# Altium footprint library lib_datalogger.PcbLib: 866 footprints (part 52 of 55)
Each footprint in its own frame and in the unit in brackets; x right, y up, seen from the top. Pads: shape width x height; smd on the part's side, far side on the other; paste and mask are expansions set on the pad; w line width, h text height; cw(c..) or ccw(c..) is an arc to the next point about the centre after c.
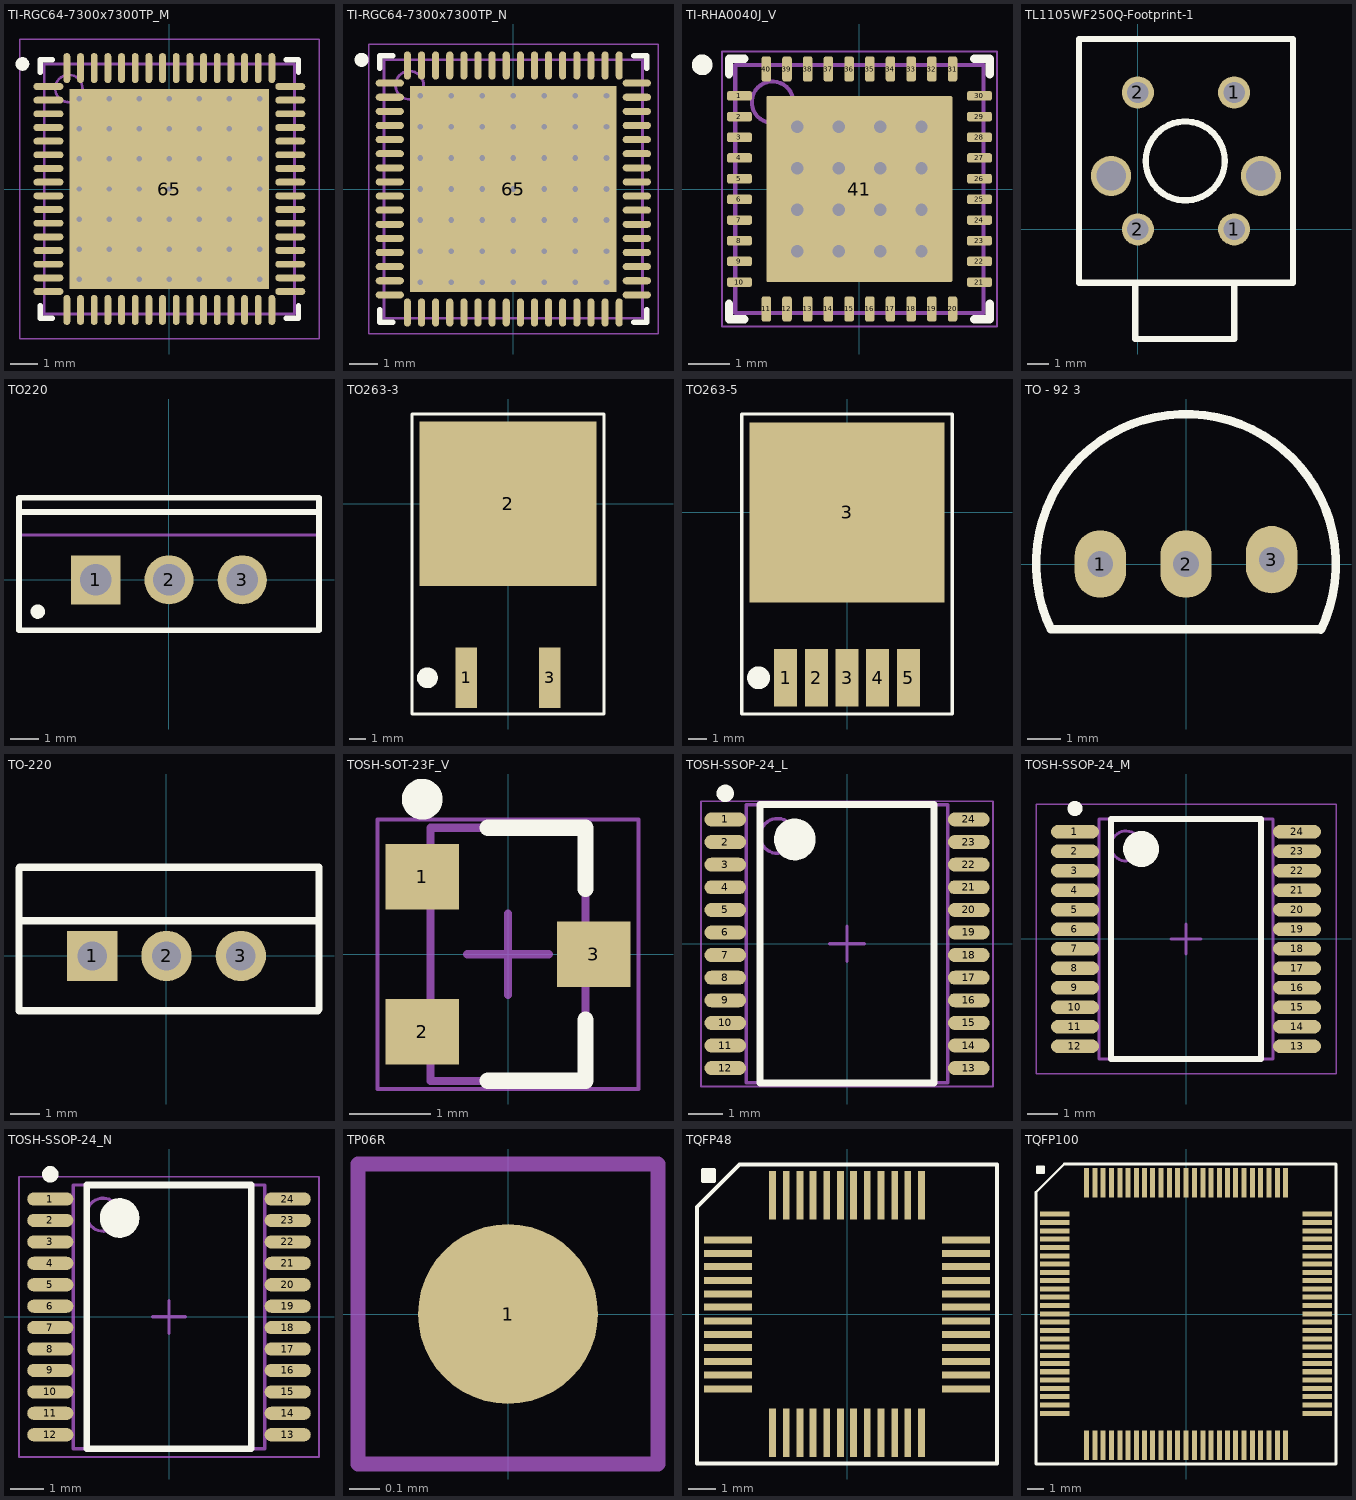
[diagram p51: the footprints below, top view; thin cyan lines are the x and y axes]

## TI-RGC64-7300x7300TP_M [mm] "QFN, 64-Leads, Body 9.15x9.15mm, Pitch 0.50mm, Thermal Pad 7.30x7.30mm, IPC Low Density"
height 1
pads (65):
  oval 1.1x0.25 smd: 1(-4.425,3.75) 2(-4.425,3.25) 3(-4.425,2.75) 4(-4.425,2.25) 5(-4.425,1.75) 6(-4.425,1.25) 7(-4.425,0.75) 8(-4.425,0.25) 9(-4.425,-0.25) 10(-4.425,-0.75) 11(-4.425,-1.25) 12(-4.425,-1.75) 13(-4.425,-2.25) 14(-4.425,-2.75) 15(-4.425,-3.25) 16(-4.425,-3.75) 33(4.425,-3.75) 34(4.425,-3.25) 35(4.425,-2.75) 36(4.425,-2.25) 37(4.425,-1.75) 38(4.425,-1.25) 39(4.425,-0.75) 40(4.425,-0.25) 41(4.425,0.25) 42(4.425,0.75) 43(4.425,1.25) 44(4.425,1.75) 45(4.425,2.25) 46(4.425,2.75) 47(4.425,3.25) 48(4.425,3.75)
  oval 0.25x1.1 smd: 17(-3.75,-4.425) 18(-3.25,-4.425) 19(-2.75,-4.425) 20(-2.25,-4.425) 21(-1.75,-4.425) 22(-1.25,-4.425) 23(-0.75,-4.425) 24(-0.25,-4.425) 25(0.25,-4.425) 26(0.75,-4.425) 27(1.25,-4.425) 28(1.75,-4.425) 29(2.25,-4.425) 30(2.75,-4.425) 31(3.25,-4.425) 32(3.75,-4.425) 49(3.75,4.425) 50(3.25,4.425) 51(2.75,4.425) 52(2.25,4.425) 53(1.75,4.425) 54(1.25,4.425) 55(0.75,4.425) 56(0.25,4.425) 57(-0.25,4.425) 58(-0.75,4.425) 59(-1.25,4.425) 60(-1.75,4.425) 61(-2.25,4.425) 62(-2.75,4.425) 63(-3.25,4.425) 64(-3.75,4.425)
  rect 7.3x7.3 smd: 65(0,0)
via -3.3,3.3 diameter 0.5 hole 0.2
via -2.2,3.3 diameter 0.5 hole 0.2
via -1.1,3.3 diameter 0.5 hole 0.2
via 0,3.3 diameter 0.5 hole 0.2
via 1.1,3.3 diameter 0.5 hole 0.2
via 2.2,3.3 diameter 0.5 hole 0.2
via 3.3,3.3 diameter 0.5 hole 0.2
via -3.3,2.2 diameter 0.5 hole 0.2
via -2.2,2.2 diameter 0.5 hole 0.2
via -1.1,2.2 diameter 0.5 hole 0.2
via 0,2.2 diameter 0.5 hole 0.2
via 1.1,2.2 diameter 0.5 hole 0.2
via 2.2,2.2 diameter 0.5 hole 0.2
via 3.3,2.2 diameter 0.5 hole 0.2
via -3.3,1.1 diameter 0.5 hole 0.2
via -2.2,1.1 diameter 0.5 hole 0.2
via -1.1,1.1 diameter 0.5 hole 0.2
via 0,1.1 diameter 0.5 hole 0.2
via 1.1,1.1 diameter 0.5 hole 0.2
via 2.2,1.1 diameter 0.5 hole 0.2
via 3.3,1.1 diameter 0.5 hole 0.2
via -3.3,0 diameter 0.5 hole 0.2
via -2.2,0 diameter 0.5 hole 0.2
via -1.1,0 diameter 0.5 hole 0.2
via 0,0 diameter 0.5 hole 0.2
via 1.1,0 diameter 0.5 hole 0.2
via 2.2,0 diameter 0.5 hole 0.2
via 3.3,0 diameter 0.5 hole 0.2
via -3.3,-1.1 diameter 0.5 hole 0.2
via -2.2,-1.1 diameter 0.5 hole 0.2
via -1.1,-1.1 diameter 0.5 hole 0.2
via 0,-1.1 diameter 0.5 hole 0.2
via 1.1,-1.1 diameter 0.5 hole 0.2
via 2.2,-1.1 diameter 0.5 hole 0.2
via 3.3,-1.1 diameter 0.5 hole 0.2
via -3.3,-2.2 diameter 0.5 hole 0.2
via -2.2,-2.2 diameter 0.5 hole 0.2
via -1.1,-2.2 diameter 0.5 hole 0.2
via 0,-2.2 diameter 0.5 hole 0.2
via 1.1,-2.2 diameter 0.5 hole 0.2
via 2.2,-2.2 diameter 0.5 hole 0.2
via 3.3,-2.2 diameter 0.5 hole 0.2
via -3.3,-3.3 diameter 0.5 hole 0.2
via -2.2,-3.3 diameter 0.5 hole 0.2
via -1.1,-3.3 diameter 0.5 hole 0.2
via 0,-3.3 diameter 0.5 hole 0.2
via 1.1,-3.3 diameter 0.5 hole 0.2
via 2.2,-3.3 diameter 0.5 hole 0.2
via 3.3,-3.3 diameter 0.5 hole 0.2
Top Overlay:
  circle w0.25: c-5.375,4.575 r0.125
  lines w0.2: -4.725,-4.275 -4.725,-4.725 -4.275,-4.725 ; -4.725,4.275 -4.725,4.725 -4.275,4.725 ; 4.275,-4.725 4.725,-4.725 4.725,-4.275 ; 4.275,4.725 4.725,4.725 4.725,4.275
Mechanical 13:
  circle w0.1: c-3.675,3.675 r0.5
  lines w0.1: -4.575,-4.575 -4.575,4.575 4.575,4.575 4.575,-4.575 -4.575,-4.575
Mechanical 15:
  lines w0.05: -5.475,-5.475 -5.475,5.475 5.475,5.475 5.475,-5.475 -5.475,-5.475
  lines w0.1: -0.5,0 0.5,0 ; 0,-0.5 0,0.5
3D body "PQFN50P900X900X100_HS-65N.step": height 1, standoff 0, extent -4.578,-4.575 4.572,4.575

## TI-RGC64-7300x7300TP_N [mm] "QFN, 64-Leads, Body 9.15x9.15mm, Pitch 0.50mm, Thermal Pad 7.30x7.30mm, IPC Medium Density"
height 1
pads (65):
  oval 1x0.25 smd: 1(-4.375,3.75) 2(-4.375,3.25) 3(-4.375,2.75) 4(-4.375,2.25) 5(-4.375,1.75) 6(-4.375,1.25) 7(-4.375,0.75) 8(-4.375,0.25) 9(-4.375,-0.25) 10(-4.375,-0.75) 11(-4.375,-1.25) 12(-4.375,-1.75) 13(-4.375,-2.25) 14(-4.375,-2.75) 15(-4.375,-3.25) 16(-4.375,-3.75) 33(4.375,-3.75) 34(4.375,-3.25) 35(4.375,-2.75) 36(4.375,-2.25) 37(4.375,-1.75) 38(4.375,-1.25) 39(4.375,-0.75) 40(4.375,-0.25) 41(4.375,0.25) 42(4.375,0.75) 43(4.375,1.25) 44(4.375,1.75) 45(4.375,2.25) 46(4.375,2.75) 47(4.375,3.25) 48(4.375,3.75)
  oval 0.25x1 smd: 17(-3.75,-4.375) 18(-3.25,-4.375) 19(-2.75,-4.375) 20(-2.25,-4.375) 21(-1.75,-4.375) 22(-1.25,-4.375) 23(-0.75,-4.375) 24(-0.25,-4.375) 25(0.25,-4.375) 26(0.75,-4.375) 27(1.25,-4.375) 28(1.75,-4.375) 29(2.25,-4.375) 30(2.75,-4.375) 31(3.25,-4.375) 32(3.75,-4.375) 49(3.75,4.375) 50(3.25,4.375) 51(2.75,4.375) 52(2.25,4.375) 53(1.75,4.375) 54(1.25,4.375) 55(0.75,4.375) 56(0.25,4.375) 57(-0.25,4.375) 58(-0.75,4.375) 59(-1.25,4.375) 60(-1.75,4.375) 61(-2.25,4.375) 62(-2.75,4.375) 63(-3.25,4.375) 64(-3.75,4.375)
  rect 7.3x7.3 smd: 65(0,0)
via -3.3,3.3 diameter 0.5 hole 0.2
via -2.2,3.3 diameter 0.5 hole 0.2
via -1.1,3.3 diameter 0.5 hole 0.2
via 0,3.3 diameter 0.5 hole 0.2
via 1.1,3.3 diameter 0.5 hole 0.2
via 2.2,3.3 diameter 0.5 hole 0.2
via 3.3,3.3 diameter 0.5 hole 0.2
via -3.3,2.2 diameter 0.5 hole 0.2
via -2.2,2.2 diameter 0.5 hole 0.2
via -1.1,2.2 diameter 0.5 hole 0.2
via 0,2.2 diameter 0.5 hole 0.2
via 1.1,2.2 diameter 0.5 hole 0.2
via 2.2,2.2 diameter 0.5 hole 0.2
via 3.3,2.2 diameter 0.5 hole 0.2
via -3.3,1.1 diameter 0.5 hole 0.2
via -2.2,1.1 diameter 0.5 hole 0.2
via -1.1,1.1 diameter 0.5 hole 0.2
via 0,1.1 diameter 0.5 hole 0.2
via 1.1,1.1 diameter 0.5 hole 0.2
via 2.2,1.1 diameter 0.5 hole 0.2
via 3.3,1.1 diameter 0.5 hole 0.2
via -3.3,0 diameter 0.5 hole 0.2
via -2.2,0 diameter 0.5 hole 0.2
via -1.1,0 diameter 0.5 hole 0.2
via 0,0 diameter 0.5 hole 0.2
via 1.1,0 diameter 0.5 hole 0.2
via 2.2,0 diameter 0.5 hole 0.2
via 3.3,0 diameter 0.5 hole 0.2
via -3.3,-1.1 diameter 0.5 hole 0.2
via -2.2,-1.1 diameter 0.5 hole 0.2
via -1.1,-1.1 diameter 0.5 hole 0.2
via 0,-1.1 diameter 0.5 hole 0.2
via 1.1,-1.1 diameter 0.5 hole 0.2
via 2.2,-1.1 diameter 0.5 hole 0.2
via 3.3,-1.1 diameter 0.5 hole 0.2
via -3.3,-2.2 diameter 0.5 hole 0.2
via -2.2,-2.2 diameter 0.5 hole 0.2
via -1.1,-2.2 diameter 0.5 hole 0.2
via 0,-2.2 diameter 0.5 hole 0.2
via 1.1,-2.2 diameter 0.5 hole 0.2
via 2.2,-2.2 diameter 0.5 hole 0.2
via 3.3,-2.2 diameter 0.5 hole 0.2
via -3.3,-3.3 diameter 0.5 hole 0.2
via -2.2,-3.3 diameter 0.5 hole 0.2
via -1.1,-3.3 diameter 0.5 hole 0.2
via 0,-3.3 diameter 0.5 hole 0.2
via 1.1,-3.3 diameter 0.5 hole 0.2
via 2.2,-3.3 diameter 0.5 hole 0.2
via 3.3,-3.3 diameter 0.5 hole 0.2
Top Overlay:
  circle w0.25: c-5.375,4.575 r0.125
  lines w0.2: -4.725,-4.275 -4.725,-4.725 -4.275,-4.725 ; -4.725,4.275 -4.725,4.725 -4.275,4.725 ; 4.275,-4.725 4.725,-4.725 4.725,-4.275 ; 4.275,4.725 4.725,4.725 4.725,4.275
Mechanical 13:
  circle w0.1: c-3.675,3.675 r0.5
  lines w0.1: -4.575,-4.575 -4.575,4.575 4.575,4.575 4.575,-4.575 -4.575,-4.575
Mechanical 15:
  lines w0.05: -5.125,-5.125 -5.125,5.125 5.125,5.125 5.125,-5.125 -5.125,-5.125
  lines w0.1: -0.5,0 0.5,0 ; 0,-0.5 0,0.5
3D body "PQFN50P900X900X100_HS-65N.step": height 1, standoff 0, extent -4.578,-4.575 4.572,4.575

## TI-RHA0040J_V [mm] "QFN, 40-Leads, Body 6x6mm, Pitch 0.5mm, Thermal Pad 4.5 x 4.5mm, TI Recommended"
height 1
pads (41):
  rrect43% 0.6x0.23 smd mask+0.07: 1(-2.9,2.25) 2(-2.9,1.75) 3(-2.9,1.25) 4(-2.9,0.75) 5(-2.9,0.25) 6(-2.9,-0.25) 7(-2.9,-0.75) 8(-2.9,-1.25) 9(-2.9,-1.75) 10(-2.9,-2.25) 21(2.9,-2.25) 22(2.9,-1.75) 23(2.9,-1.25) 24(2.9,-0.75) 25(2.9,-0.25) 26(2.9,0.25) 27(2.9,0.75) 28(2.9,1.25) 29(2.9,1.75) 30(2.9,2.25)
  rrect43% 0.23x0.6 smd mask+0.07: 11(-2.25,-2.9) 12(-1.75,-2.9) 13(-1.25,-2.9) 14(-0.75,-2.9) 15(-0.25,-2.9) 16(0.25,-2.9) 17(0.75,-2.9) 18(1.25,-2.9) 19(1.75,-2.9) 20(2.25,-2.9) 31(2.25,2.9) 32(1.75,2.9) 33(1.25,2.9) 34(0.75,2.9) 35(0.25,2.9) 36(-0.25,2.9) 37(-0.75,2.9) 38(-1.25,2.9) 39(-1.75,2.9) 40(-2.25,2.9)
  rrect2% 4.5x4.5 smd paste-2.5: 41(0,0)
via -1.5,1.5 diameter 0.6 hole 0.3
via -1.5,-1.5 diameter 0.6 hole 0.3
via 1.5,-1.5 diameter 0.6 hole 0.3
via 1.5,1.5 diameter 0.6 hole 0.3
via 0.5,1.5 diameter 0.6 hole 0.3
via 0.5,0.5 diameter 0.6 hole 0.3
via 0.5,-0.5 diameter 0.6 hole 0.3
via 0.5,-1.5 diameter 0.6 hole 0.3
via 1.5,-0.5 diameter 0.6 hole 0.3
via 1.5,0.5 diameter 0.6 hole 0.3
via -1.5,0.5 diameter 0.6 hole 0.3
via -1.5,-0.5 diameter 0.6 hole 0.3
via -0.5,-1.5 diameter 0.6 hole 0.3
via -0.5,-0.5 diameter 0.6 hole 0.3
via -0.5,0.5 diameter 0.6 hole 0.3
via -0.5,1.5 diameter 0.6 hole 0.3
Top Overlay:
  circle w0.25: c-3.8,3 r0.125
  lines w0.2: -3.15,-2.775 -3.15,-3.15 -2.775,-3.15 ; -3.15,2.775 -3.15,3.15 -2.775,3.15 ; 2.775,-3.15 3.15,-3.15 3.15,-2.775 ; 2.775,3.15 3.15,3.15 3.15,2.775
Top Paste:
  rectangle: -0.6,-2.1 0.6,-0.9
  rectangle: -0.6,0.9 0.6,2.1
  rectangle: -2.1,0.9 -0.9,2.1
  region: 2.1,2.1 0.9,2.1 0.9,0.9 2.1,0.9
  region: 2.1,-0.9 0.9,-0.9 0.9,-2.1 2.1,-2.1
  region: 2.1,0.6 0.9,0.6 0.9,-0.6 2.1,-0.6
  rectangle: -2.1,-0.6 -0.9,0.6
  rectangle: -2.1,-2.1 -0.9,-0.9
  rectangle: -0.6,-0.6 0.6,0.6
Mechanical 1:
  text ".Designator" at -1.854,-0.508 h1.02
Mechanical 13:
  circle w0.1: c-2.1,2.1 r0.5
  lines w0.1: -3,-3 3,-3 3,3 -3,3 -3,-3
Mechanical 15:
  lines w0.05: -3.325,-3.325 3.325,-3.325 3.325,3.325 -3.325,3.325 -3.325,-3.325
  lines w0.1: -0.5,0 0.5,0 ; 0,-0.5 0,0.5
3D body "QFN50P600X600X100_HS-41L.step": height 1, standoff 0, extent -3.001,-3.001 3.001,3.001

## TL1105WF250Q-Footprint-1 [mil]
pads (6):
  round 60 hole 40: 1(180,0) 1(180,255.91) 2(0,0) 2(0,255.91)
  round 75 hole 55: ""(-50,100) ""(230,100)
Top Overlay:
  circle w11.81: c88.58,127.95 r73.82
  lines w12: -110,80.91 -110,355.91 290,355.91 290,80.91 ; -110,175 -110,-100 290,-100 290,175 ; -5,-100 -5,-205 175,-205 180,-205 180,-100
3D body "User Library-TL1105 Tactile Switch 6x6 mm.step": height 322.05, standoff -95.28, extent -71.79,-168.9 251.79,157.87

## TO220 [mm] "TO, Thru-Hole, Vertical, Heatsink Mounted; 3 In-Line Leads; Pitch 2.54 mm"
height 19.7
pads (3):
  rect 1.7x1.7 hole 1.1: 1(-2.54,0)
  round 1.7 hole 1.1: 2(0,0) 3(2.54,0)
Top Overlay:
  circle w0.25: c-4.55,-1.1 r0.125
  lines w0.2: -5.2,2.35 5.2,2.35 ; -5.2,-1.75 -5.2,2.85 5.2,2.85 5.2,-1.75 -5.2,-1.75
Mechanical 13:
  lines w0.1: -5.2,1.55 5.2,1.55 ; -5.2,-1.75 5.2,-1.75 5.2,2.85 -5.2,2.85 -5.2,-1.75
Mechanical 15:
  lines w0.1: -0.5,0 0.5,0 ; 0,-0.5 0,0.5
3D body: height 3.5, standoff 0, extent 1.83,-0.295 3.25,0.295
3D body: height 3.5, standoff -10, extent 2.168,-0.295 2.913,0.295
3D body: height 3.5, standoff 0, extent -3.25,-0.295 -1.83,0.295
3D body: height 3.5, standoff -10, extent -2.912,-0.295 -2.167,0.295
3D body: height 3.5, standoff -10, extent -0.373,-0.295 0.373,0.295
3D body: height 3.5, standoff 0, extent -0.71,-0.295 0.71,0.295
3D body: height 13.05, standoff 3.5, extent -5.25,-1.8 5.25,2.9
3D body: height 19.7, standoff 13.05, extent -5.199,1.551 5.199,2.849

## TO263-3 [mm] "D²Pak (2 Leads + Tab)"
pads (3):
  rect 1.3x3.7 smd: 1(-2.54,-10.6) 3(2.54,-10.6)
  rect 10.8x10 smd: 2(0,0)
Top Overlay:
  circle w0.7: c-4.907,-10.6 r0.284
  lines w0.178: -5.842,-12.802 -5.842,5.461 5.842,5.461 5.842,-12.802 -5.842,-12.802
3D body "SW3dPS-TO263-3.STEP": height 4.78, standoff -0.02, extent -5,-11.505 5,4.165

## TO263-5 [mm]
pads (6):
  rect 1.27x3.2 smd: 1(-3.4,-9.169) 2(-1.7,-9.169) 3(0,-9.169) 4(1.7,-9.169) 5(3.4,-9.169)
  rect 10.8x10 smd: 3(0,0)
Top Overlay:
  circle w0.7: c-4.907,-9.169 r0.284
  lines w0.178: -5.842,-11.176 -5.842,5.461 5.842,5.461 5.842,-11.176 -5.842,-11.176
3D body "User Library-TO-263-5.STEP": height 4.56, standoff 0, extent -5.08,-10.078 5.08,3.937

## TO - 92 3 [mil]
pads (3):
  oval 60x78.74 hole 30: 1(-100,0) 2(0,0) 3(100,5)
Top Overlay:
  lines w10: 156.51,-76.22 -157.53,-76.22 cw(c0,0) 157.33,-76.62

## TO-220 [mm]
pads (3):
  rect 1.72x1.72 hole 1: 1(-2.524,0.001)
  round 1.72 hole 1: 2(0.016,0.001) 3(2.556,0.001)
Top Overlay:
  lines w0.254: -5,1.2 5.2,1.2 ; -5.024,-1.874 -5.024,-0.124 -5.024,3.002 -4.993,3.033 5.226,3.033 5.226,-1.825 5.177,-1.874 -5.024,-1.874
3D body "User Library-mosfet fairchild semi to220 fqpfxxx.STEP": height 18.3, standoff -10.55, extent -5.112,-1.857 5.048,2.943

## TOSH-SOT-23F_V [mm] "SOTFL, 3-Leads, Body 3.1x1.9mm, Pitch 0.95mm"
height 0.88
pads (3):
  rect 0.9x0.8 smd: 1(-1.05,0.95) 2(-1.05,-0.95) 3(1.05,0)
Top Overlay:
  circle w0.25: c-1.05,1.9 r0.125
  lines w0.2: -0.25,-1.55 0.95,-1.55 0.95,-0.8 ; -0.25,1.55 0.95,1.55 0.95,0.8
Mechanical 13:
  lines w0.1: -0.95,-1.55 0.95,-1.55 0.95,1.55 -0.95,1.55 -0.95,-1.55
Mechanical 15:
  lines w0.05: -1.6,-1.65 1.6,-1.65 1.6,1.65 -1.6,1.65 -1.6,-1.65
  lines w0.1: -0.5,0 0.5,0 ; 0,-0.5 0,0.5
3D body "SOTFL95P240X88-3L.step": height 0.88, standoff 0, extent -1.2,-1.548 1.2,1.548

## TOSH-SSOP-24_L [mm] "SOP, 24-Leads, Body 8x5.8mm, Pitch 0.65mm, IPC High Density"
height 1.6
pads (24):
  oval 1.2x0.4 smd: 1(-3.5,3.575) 2(-3.5,2.925) 3(-3.5,2.275) 4(-3.5,1.625) 5(-3.5,0.975) 6(-3.5,0.325) 7(-3.5,-0.325) 8(-3.5,-0.975) 9(-3.5,-1.625) 10(-3.5,-2.275) 11(-3.5,-2.925) 12(-3.5,-3.575) 13(3.5,-3.575) 14(3.5,-2.925) 15(3.5,-2.275) 16(3.5,-1.625) 17(3.5,-0.975) 18(3.5,-0.325) 19(3.5,0.325) 20(3.5,0.975) 21(3.5,1.625) 22(3.5,2.275) 23(3.5,2.925) 24(3.5,3.575)
Top Overlay:
  circle w0.25: c-3.5,4.325 r0.125
  circle w0.6: c-1.5,3 r0.3
  lines w0.2: -2.5,-4 -2.5,4 2.5,4 2.5,-4 -2.5,-4
Mechanical 13:
  circle w0.1: c-2,3.1 r0.5
  lines w0.1: -2.9,-4 -2.9,4 2.9,4 2.9,-4 -2.9,-4
Mechanical 15:
  lines w0.05: -4.2,-4.1 -4.2,4.1 4.2,4.1 4.2,-4.1 -4.2,-4.1
  lines w0.1: -0.5,0 0.5,0 ; 0,-0.5 0,0.5
3D body "TSOP65P760X160-24L.step": height 1.6, standoff 0, extent -3.8,-4 3.8,4

## TOSH-SSOP-24_M [mm] "SOP, 24-Leads, Body 8x5.8mm, Pitch 0.65mm, IPC Low Density"
height 1.6
pads (24):
  oval 1.6x0.45 smd: 1(-3.7,3.575) 2(-3.7,2.925) 3(-3.7,2.275) 4(-3.7,1.625) 5(-3.7,0.975) 6(-3.7,0.325) 7(-3.7,-0.325) 8(-3.7,-0.975) 9(-3.7,-1.625) 10(-3.7,-2.275) 11(-3.7,-2.925) 12(-3.7,-3.575) 13(3.7,-3.575) 14(3.7,-2.925) 15(3.7,-2.275) 16(3.7,-1.625) 17(3.7,-0.975) 18(3.7,-0.325) 19(3.7,0.325) 20(3.7,0.975) 21(3.7,1.625) 22(3.7,2.275) 23(3.7,2.925) 24(3.7,3.575)
Top Overlay:
  circle w0.25: c-3.7,4.35 r0.125
  circle w0.6: c-1.5,3 r0.3
  lines w0.2: -2.5,-4 -2.5,4 2.5,4 2.5,-4 -2.5,-4
Mechanical 13:
  circle w0.1: c-2,3.1 r0.5
  lines w0.1: -2.9,-4 -2.9,4 2.9,4 2.9,-4 -2.9,-4
Mechanical 15:
  lines w0.05: -5,-4.5 -5,4.5 5,4.5 5,-4.5 -5,-4.5
  lines w0.1: -0.5,0 0.5,0 ; 0,-0.5 0,0.5
3D body "TSOP65P760X160-24M.step": height 1.6, standoff 0, extent -3.8,-4 3.8,4

## TOSH-SSOP-24_N [mm] "SOP, 24-Leads, Body 8x5.8mm, Pitch 0.65mm, IPC Medium Density"
height 1.6
pads (24):
  oval 1.4x0.4 smd: 1(-3.6,3.575) 2(-3.6,2.925) 3(-3.6,2.275) 4(-3.6,1.625) 5(-3.6,0.975) 6(-3.6,0.325) 7(-3.6,-0.325) 8(-3.6,-0.975) 9(-3.6,-1.625) 10(-3.6,-2.275) 11(-3.6,-2.925) 12(-3.6,-3.575) 13(3.6,-3.575) 14(3.6,-2.925) 15(3.6,-2.275) 16(3.6,-1.625) 17(3.6,-0.975) 18(3.6,-0.325) 19(3.6,0.325) 20(3.6,0.975) 21(3.6,1.625) 22(3.6,2.275) 23(3.6,2.925) 24(3.6,3.575)
Top Overlay:
  circle w0.25: c-3.6,4.325 r0.125
  circle w0.6: c-1.5,3 r0.3
  lines w0.2: -2.5,-4 -2.5,4 2.5,4 2.5,-4 -2.5,-4
Mechanical 13:
  circle w0.1: c-2,3.1 r0.5
  lines w0.1: -2.9,-4 -2.9,4 2.9,4 2.9,-4 -2.9,-4
Mechanical 15:
  lines w0.05: -4.55,-4.25 -4.55,4.25 4.55,4.25 4.55,-4.25 -4.55,-4.25
  lines w0.1: -0.5,0 0.5,0 ; 0,-0.5 0,0.5
3D body "TSOP65P760X160-24N.step": height 1.6, standoff 0, extent -3.8,-4 3.8,4

## TP06R [mm] "Testpoint, round, d=0.6mm"
pads (1):
  round 0.6 smd paste-1: 1(0,0)
Mechanical 13:
  lines w0.05: -0.5,-0.5 -0.5,0.5 0.5,0.5 0.5,-0.5 -0.5,-0.5
Top Designator:
  text ".Designator" at -1.27,0.254 h0.6

## TQFP48 [mil]
height 4
pads (48):
  rect 70x10 smd: 1(-174,108) 2(-174,88) 3(-174,69) 4(-174,49) 5(-174,29) 6(-174,10) 7(-174,-10) 8(-174,-30) 9(-174,-49) 10(-174,-69) 11(-174,-89) 12(-174,-109) 25(173,-109) 26(173,-89) 27(173,-69) 28(173,-49) 29(173,-30) 30(173,-10) 31(173,10) 32(173,29) 33(173,49) 34(173,69) 35(173,88) 36(173,108)
  rect 10x70 smd: 13(-109,-173) 14(-89,-173) 15(-69,-173) 16(-50,-173) 17(-30,-173) 18(-10,-173) 19(9,-173) 20(29,-173) 21(49,-173) 22(69,-173) 23(88,-173) 24(108,-173) 37(108,173) 38(88,173) 39(69,173) 40(49,173) 41(29,173) 42(9,173) 43(-10,173) 44(-30,173) 45(-50,173) 46(-69,173) 47(-89,173) 48(-109,173)
Top Overlay:
  region: -210,194 -194,194 -194,210 -210,210
  lines w6: -219,-218 218,-218 218,218 -157,218 -219,156 -219,-218 ; -210,194 -194,194 -194,210 -210,210 -210,194
3D body "TQFP48.step": height 43.31, standoff 0, extent -178.01,-177.51 177.01,177.51

## TQFP100 [mil]
pads (100):
  rect 70x12 smd: 1(-311,237) 2(-311,217) 3(-311,197) 4(-311,178) 5(-311,158) 6(-311,138) 7(-311,119) 8(-311,99) 9(-311,79) 10(-311,59) 11(-311,40) 12(-311,20) 13(-311,0) 14(-311,-19) 15(-311,-39) 16(-311,-59) 17(-311,-78) 18(-311,-98) 19(-311,-118) 20(-311,-137) 21(-311,-157) 22(-311,-177) 23(-311,-196) 24(-311,-216) 25(-311,-236) 51(311,-236) 52(311,-216) 53(311,-196) 54(311,-177) 55(311,-157) 56(311,-137) 57(311,-118) 58(311,-98) 59(311,-78) 60(311,-59) 61(311,-39) 62(311,-19) 63(311,0) 64(311,20) 65(311,40) 66(311,59) 67(311,79) 68(311,99) 69(311,119) 70(311,138) 71(311,158) 72(311,178) 73(311,197) 74(311,217) 75(311,237)
  rect 12x70 smd: 26(-236,-311) 27(-216,-311) 28(-197,-311) 29(-177,-311) 30(-157,-311) 31(-138,-311) 32(-118,-311) 33(-98,-311) 34(-79,-311) 35(-59,-311) 36(-39,-311) 37(-20,-311) 38(0,-311) 39(20,-311) 40(40,-311) 41(59,-311) 42(79,-311) 43(99,-311) 44(118,-311) 45(138,-311) 46(158,-311) 47(177,-311) 48(197,-311) 49(217,-311) 50(236,-311) 76(236,311) 77(217,311) 78(197,311) 79(177,311) 80(158,311) 81(138,311) 82(118,311) 83(99,311) 84(79,311) 85(59,311) 86(40,311) 87(20,311) 88(0,311) 89(-20,311) 90(-39,311) 91(-59,311) 92(-79,311) 93(-98,311) 94(-118,311) 95(-138,311) 96(-157,311) 97(-177,311) 98(-197,311) 99(-216,311) 100(-236,311)
Top Overlay:
  region: -353,335 -338,335 -338,350 -353,350
  lines w6: -356,-356 356,-356 356,356 -289,356 -356,289 -356,-356 ; -353,335 -338,335 -338,350 -353,350 -353,335
3D body "TQFP100.step": height 43.31, standoff 0, extent -315.3,-315.3 315.3,315.3